# Altium footprint library Library.PcbLib: 298 footprints (part 16 of 19)
Each footprint in its own frame and in the unit in brackets; x right, y up, seen from the top. Pads: shape width x height; smd on the part's side, far side on the other; paste and mask are expansions set on the pad; w line width, h text height; cw(c..) or ccw(c..) is an arc to the next point about the centre after c.
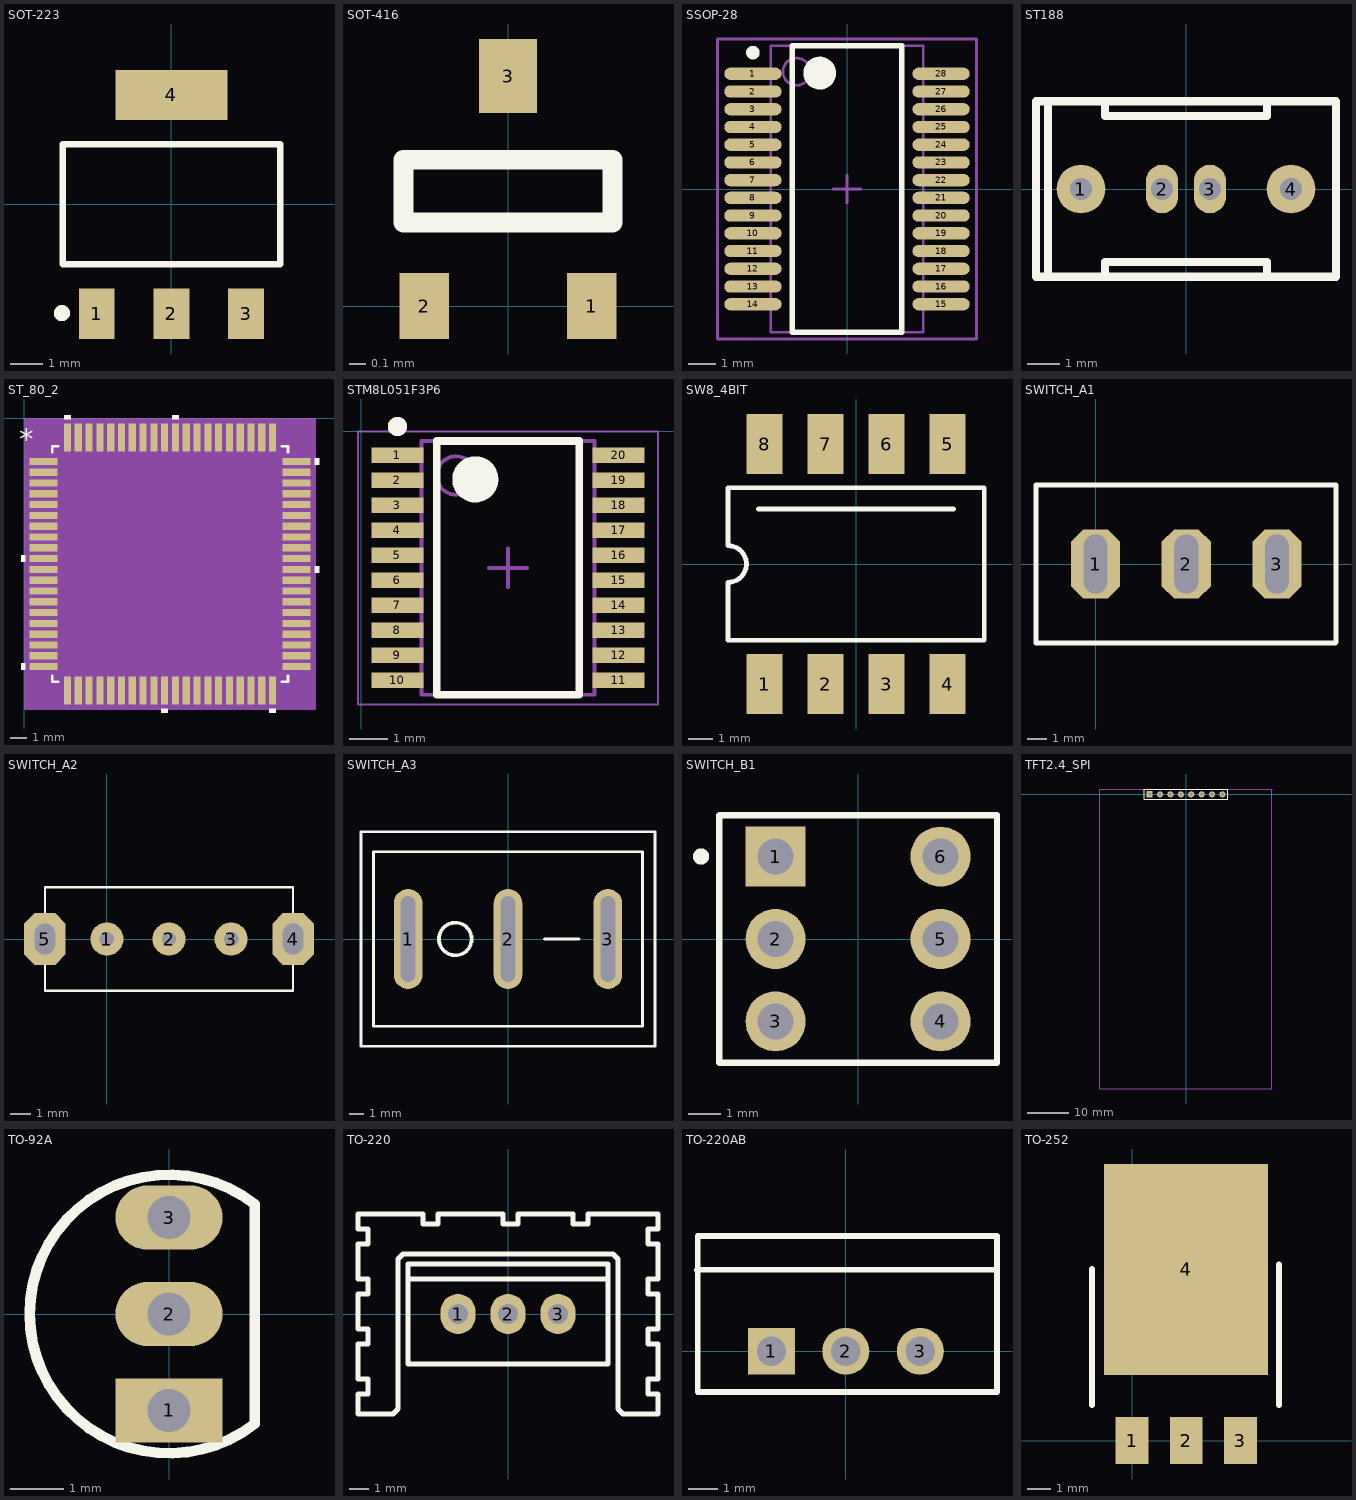
[diagram p15: the footprints below, top view; thin cyan lines are the x and y axes]

## SOT-223 [mm]
height 1.8
pads (4):
  rect 1.1x1.55 smd: 1(-2.3,-3.375) 2(0,-3.375) 3(2.3,-3.375)
  rect 3.45x1.55 smd: 4(0,3.375)
Top Overlay:
  circle w0.25: c-3.376,-3.353 r0.125
  lines w0.2: -3.35,-1.85 -3.35,1.85 3.35,1.85 3.35,-1.85 -3.35,-1.85
3D body: height 0.8, standoff 0, extent -3.302,-2.032 3.302,2.159
3D body: height 0.3, standoff 0, extent -1.651,2.159 1.651,3.429
3D body: height 0.3, standoff 0, extent -2.794,-3.937 -1.905,-2.032
3D body: height 0.3, standoff 0, extent -0.508,-3.937 0.381,-2.032
3D body: height 0.3, standoff 0, extent 1.905,-3.937 2.794,-2.032

## SOT-416 [mm]
height 0.7
pads (3):
  rect 0.3x0.4 smd: 1(0.508,0) 2(-0.508,0)
  rect 0.35x0.45 smd: 3(0,1.397)
Top Overlay:
  lines w0.12: -0.635,0.508 0.635,0.508 0.635,0.889 -0.635,0.889 -0.635,0.508

## SSOP-28 [mm] "FT232"
height 2
pads (28):
  oval 2.1x0.45 smd: 1(-3.45,4.225) 2(-3.45,3.575) 3(-3.45,2.925) 4(-3.45,2.275) 5(-3.45,1.625) 6(-3.45,0.975) 7(-3.45,0.325) 8(-3.45,-0.325) 9(-3.45,-0.975) 10(-3.45,-1.625) 11(-3.45,-2.275) 12(-3.45,-2.925) 13(-3.45,-3.575) 14(-3.45,-4.225) 15(3.45,-4.225) 16(3.45,-3.575) 17(3.45,-2.925) 18(3.45,-2.275) 19(3.45,-1.625) 20(3.45,-0.975) 21(3.45,-0.325) 22(3.45,0.325) 23(3.45,0.975) 24(3.45,1.625) 25(3.45,2.275) 26(3.45,2.925) 27(3.45,3.575) 28(3.45,4.225)
Top Overlay:
  circle w0.6: c-1,4.25 r0.3
  circle w0.25: c-3.45,5 r0.125
  lines w0.2: -2,-5.25 2,-5.25 2,5.25 -2,5.25 -2,-5.25
Mechanical 13:
  circle w0.1: c-1.85,4.3 r0.5
  lines w0.1: -2.8,-5.25 2.8,-5.25 2.8,5.25 -2.8,5.25 -2.8,-5.25
Mechanical 15:
  lines w0.1: -0.5,0 0.5,0 ; 0,-0.5 0,0.5 ; -4.75,-5.5 4.75,-5.5 4.75,5.5 -4.75,5.5 -4.75,-5.5
3D body: height 2, standoff 0.09, extent -2.8,-5.25 2.8,5.25

## ST188 [mm] "反射式光电传感器"
height 8.2
pads (4):
  round 1.524 hole 0.7: 1(-3.29,0) 4(3.29,0)
  oval 1x1.524 hole 0.7: 2(-0.75,0) 3(0.75,0)
Top Overlay:
  lines w0.254: -4.318,-2.75 -4.318,2.75 ; -2.54,-2.75 -2.54,-2.286 2.54,-2.286 2.54,-2.75 ; -2.54,2.75 -2.54,2.286 2.54,2.286 2.54,2.75 ; -4.7,-2.75 -4.7,2.75 4.7,2.75 4.7,-2.75 -4.7,-2.75

## ST_80_2 [mil]
pads (80):
  rect 66x17 smd mask+5: 1(46,-102.89) 2(46,-128.48) 3(46,-154.07) 4(46,-179.66) 5(46,-205.25) 6(46,-230.84) 7(46,-256.43) 8(46,-282.02) 9(46,-307.61) 10(46,-333.2) 11(46,-358.8) 12(46,-384.39) 13(46,-409.98) 14(46,-435.57) 15(46,-461.16) 16(46,-486.75) 17(46,-512.34) 18(46,-537.93) 19(46,-563.52) 20(46,-589.11) 41(646,-589.11) 42(646,-563.52) 43(646,-537.93) 44(646,-512.34) 45(646,-486.75) 46(646,-461.16) 47(646,-435.57) 48(646,-409.98) 49(646,-384.39) 50(646,-358.8) 51(646,-333.2) 52(646,-307.61) 53(646,-282.02) 54(646,-256.43) 55(646,-230.84) 56(646,-205.25) 57(646,-179.66) 58(646,-154.07) 59(646,-128.48) 60(646,-102.89)
  rect 17x66 smd mask+5: 21(102.89,-646) 22(128.48,-646) 23(154.07,-646) 24(179.66,-646) 25(205.25,-646) 26(230.84,-646) 27(256.43,-646) 28(282.02,-646) 29(307.61,-646) 30(333.2,-646) 31(358.8,-646) 32(384.39,-646) 33(409.98,-646) 34(435.57,-646) 35(461.16,-646) 36(486.75,-646) 37(512.34,-646) 38(537.93,-646) 39(563.52,-646) 40(589.11,-646) 61(589.11,-46) 62(563.52,-46) 63(537.93,-46) 64(512.34,-46) 65(486.75,-46) 66(461.16,-46) 67(435.57,-46) 68(409.98,-46) 69(384.39,-46) 70(358.8,-46) 71(333.2,-46) 72(307.61,-46) 73(282.02,-46) 74(256.43,-46) 75(230.84,-46) 76(205.25,-46) 77(179.66,-46) 78(154.07,-46) 79(128.48,-46) 80(102.89,-46)
Top Overlay:
  region: 3,-325.7 -7,-325.7 -7,-340.7 3,-340.7
  region: 3,-581.61 -7,-581.61 -7,-596.61 3,-596.61
  region: 340.7,-689 325.7,-689 325.7,-699 340.7,-699
  region: 596.61,-689 581.61,-689 581.61,-699 596.61,-699
  region: 689,-351.3 699,-351.3 699,-366.3 689,-366.3
  region: 689,-95.39 699,-95.39 699,-110.39 689,-110.39
  region: 366.3,-3 351.3,-3 351.3,7 366.3,7
  region: 110.39,-3 95.39,-3 95.39,7 110.39,7
  lines w6: 66.5,-610.71 66.5,-625.5 81.29,-625.5 ; 66.5,-81.29 66.5,-66.5 81.29,-66.5 ; 610.71,-625.5 625.5,-625.5 625.5,-610.71 ; 610.71,-66.5 625.5,-66.5 625.5,-81.29
  text "*" at -12,-75.09 h50
Mechanical 13:
  text "*" at -12,-75.09 h50
Mechanical 15:
  region: 689,-689 3,-689 3,-3 689,-3
  lines w6: 3,-689 3,-3 689,-3 689,-689 3,-689
3D body "ST_80_2.stp": height 63.1, standoff 0, extent 27,-665 665,-27

## STM8L051F3P6 [mm]
pads (20):
  rect 1.35x0.4 smd: 1(0.935,-0.631) 2(0.935,-1.281) 3(0.935,-1.931) 4(0.935,-2.581) 5(0.935,-3.231) 6(0.935,-3.881) 7(0.935,-4.531) 8(0.935,-5.181) 9(0.935,-5.831) 10(0.935,-6.481) 11(6.685,-6.481) 12(6.685,-5.831) 13(6.685,-5.181) 14(6.685,-4.531) 15(6.685,-3.881) 16(6.685,-3.231) 17(6.685,-2.581) 18(6.685,-1.931) 19(6.685,-1.281) 20(6.685,-0.631)
Top Overlay:
  circle w0.6: c2.96,-1.256 r0.3
  circle w0.25: c0.935,0.119 r0.125
  lines w0.2: 1.96,-6.856 5.66,-6.856 5.66,-0.256 1.96,-0.256 1.96,-6.856
Mechanical 13:
  circle w0.1: c2.46,-1.156 r0.5
  lines w0.1: 1.56,-6.856 6.06,-6.856 6.06,-0.256 1.56,-0.256 1.56,-6.856
Mechanical 15:
  lines w0.05: -0.09,-7.106 7.71,-7.106 7.71,-0.006 -0.09,-0.006 -0.09,-7.106
  lines w0.1: 3.31,-3.556 4.31,-3.556 ; 3.81,-4.056 3.81,-3.056
3D body: height 1.2, standoff 0.1, extent 1.56,-6.856 6.06,-0.256

## SW8_4BIT [mm] "贴片拨码开关"
height 1.75
pads (8):
  rect 1.5x2.5 smd: 1(-3.81,-5) 2(-1.27,-5) 3(1.27,-5) 4(3.81,-5) 5(3.81,5) 6(1.27,5) 7(-1.27,5) 8(-3.81,5)
Top Overlay:
  lines w0.2: -4.064,2.286 4.064,2.286 ; -5.334,-3.175 -5.334,-0.762 ccw(c-5.334,0) -5.334,0.762 -5.334,3.175 5.334,3.175 5.334,-3.175 -5.334,-3.175
3D body: height 2, standoff 0, extent -5.207,-3.429 5.08,3.429
3D body: height 2.05, standoff 2, extent -4.572,-2.032 -3.048,2.413
3D body: height 2.05, standoff 2, extent -2.032,-2.032 -0.508,2.413
3D body: height 2.05, standoff 2, extent 0.508,-2.032 2.032,2.413
3D body: height 2.05, standoff 2, extent 3.048,-2.032 4.572,2.413
3D body: height 2.15, standoff 2.05, extent -4.572,0.889 -3.048,2.413
3D body: height 2.15, standoff 2.05, extent -2.032,-2.032 -0.508,-0.508
3D body: height 2.15, standoff 2.05, extent 0.508,0.889 2.032,2.413
3D body: height 2.15, standoff 2.05, extent 3.048,0.889 4.572,2.413

## SWITCH_A1 [mm] "扭子开关"
height 10
pads (3):
  oct 2.5x3.5 hole 1.2 slot 3 at 90 deg: 1(0,0) 2(4.6,0) 3(9.2,0)
Top Overlay:
  lines w0.254: -3.02,-4 12.164,-4 12.192,-3.972 12.192,4 -3.02,4 -3.02,-4

## SWITCH_A2 [mm] "平拨开关"
height 9
pads (5):
  round 1.6 hole 0.7: 1(0,0) 2(3,0) 3(6,0)
  oct 2x2.5 hole 1 slot 1.5 at 90 deg: 4(9,0) 5(-3,0)
Top Overlay:
  lines w0.1: -3,-2.5 9,-2.5 9,2.5 -3,2.5 -3,-2.5

## SWITCH_A3 [mm] "单刀单掷开关"
height 9
pads (3):
  oval 2x7 hole 1 slot 6 at 90 deg: 1(-6.985,0) 2(0,0) 3(6.985,0)
Top Overlay:
  circle w0.254: c-3.683,0 r1.143
  lines w0.2: 2.54,0 4.953,0 ; -10.287,-7.493 -10.287,7.493 10.287,7.493 10.287,-7.493 -10.287,-7.493 ; -9.398,-6.096 9.398,-6.096 9.398,6.096 -9.398,6.096 -9.398,-6.096

## SWITCH_B1 [mm] "单刀"
height 1.75
pads (6):
  rect 1.85x1.85 hole 1.1: 1(-2.54,2.54)
  round 1.85 hole 1.1: 2(-2.54,0) 3(-2.54,-2.54) 4(2.54,-2.54) 5(2.54,0) 6(2.54,2.54)
Top Overlay:
  circle w0.25: c-4.836,2.541 r0.125
  lines w0.2: -4.28,-3.81 4.28,-3.81 4.28,3.81 -4.28,3.81 -4.28,-3.81

## TFT2.4_SPI [mm]
pads (8):
  rect 1.5x1.5 hole 0.9: 1(-8.89,0)
  round 1.5 hole 0.9: 2(-6.35,0) 3(-3.81,0) 4(-1.27,0) 5(1.27,0) 6(3.81,0) 7(6.35,0) 8(8.89,0)
Top Overlay:
  lines w0.2: -10.16,-1.219 10.109,-1.219 10.135,-1.219 10.135,1.27 10.109,1.295 -10.16,1.295 -10.16,-1.219
Mechanical 15:
  lines w0.2: -21.006,1.194 -21.006,-71.958 20.98,-71.958 20.98,1.27 ; -21,1.27 21,1.27
3D body "HDR2.54-1P.STEP": height 8.5, standoff -3, extent -10.16,-1.27 -7.62,1.27
3D body "HDR2.54-1P.STEP": height 8.5, standoff -3, extent -7.62,-1.27 -5.08,1.27
3D body "HDR2.54-1P.STEP": height 8.5, standoff -3, extent -5.08,-1.27 -2.54,1.27
3D body "HDR2.54-1P.STEP": height 8.5, standoff -3, extent -2.54,-1.27 0,1.27
3D body "HDR2.54-1P.STEP": height 8.5, standoff -3, extent 0,-1.27 2.54,1.27
3D body "HDR2.54-1P.STEP": height 8.5, standoff -3, extent 2.54,-1.27 5.08,1.27
3D body "HDR2.54-1P.STEP": height 8.5, standoff -3, extent 5.08,-1.27 7.62,1.27
3D body "HDR2.54-1P.STEP": height 8.5, standoff -3, extent 7.62,-1.27 10.16,1.27

## TO-92A [mm]
height 6.86
pads (3):
  rect 2x1.2 hole 0.8: 1(0,-1.8)
  oval 2x1.2 hole 0.8: 2(0,0) 3(0,1.8)
Top Overlay:
  lines w0.2: 1.601,-2.049 cw(c0,0) 1.601,2.049 ; 1.6,-1.99 1.6,1.99
3D body "TO92A.STEP": height 7.6, standoff -3, extent -2.3,-2.3 1.3,2.3

## TO-220 [mil]
pads (3):
  oval 70x80 hole 39.37: 1(-100,0) 2(0,0) 3(100,0)
Top Overlay:
  lines w10: -200,70 200,70 ; -300,-200 -230,-200 -220,-190 -220,110 -210,120 210,120 220,110 220,-190 230,-200 250,-200 300,-200 300,-160 280,-160 280,-130 300,-130 300,-60 280,-60 280,-30 300,-30 300,40 280,40 280,70 300,70 300,140 280,140 280,170 300,170 300,200 160,200 160,180 130,180 130,200 20,200 20,180 -10,180 -10,200 -140,200 -140,180 -170,180 -170,200 -300,200 -300,170 -280,170 -280,140 -300,140 -300,70 -280,70 -280,40 -300,40 -300,-30 -280,-30 -280,-60 -300,-60 -300,-130 -280,-130 -280,-160 -300,-160 -300,-200 ; -200,-100 200,-100 200,100 -200,100 -200,-100
3D body "TO-220.STEP": height 866.14, standoff -87.4, extent -196.41,-69 202.41,143.6

## TO-220AB [mm] "1G2D3S- TO, Thru-Hole, Vertical, Heatsink Mounted; 3 In-Line Leads; Pitch 2.54 mm"
height 19.3
pads (3):
  rect 1.6x1.6 hole 1: 1(-2.54,0)
  round 1.6 hole 1: 2(0,0) 3(2.54,0)
Top Overlay:
  lines w0.2: -5.08,2.769 5.156,2.782 ; -5.055,-1.397 5.156,-1.397 5.156,3.937 -5.055,3.937 -5.055,-1.397
3D body: height 0.6, standoff 0, extent -3.302,-0.381 -1.778,0.508
3D body: height 0.6, standoff 0, extent -0.762,-0.381 0.762,0.508
3D body: height 0.6, standoff 0, extent 1.778,-0.381 3.302,0.508
3D body "TO-220.STEP": height 22, standoff -2.22, extent -5.025,-1.514 5.105,3.886

## TO-252 [mm]
pads (4):
  rect 1.4x2 smd: 1(0,0) 2(2.311,0) 3(4.623,0)
  rect 7x9 smd: 4(2.3,7.3)
Top Overlay:
  lines w0.254: -1.716,1.524 -1.716,7.315 ; 6.261,1.524 6.261,7.515
3D body "CircuitWorks-TO-252.step": height 2.3, standoff 0, extent -0.979,0.14 5.601,9.84